# Altium footprint library uc_dev.PcbLib: 264 footprints (part 7 of 17)
Each footprint in its own frame and in the unit in brackets; x right, y up, seen from the top. Pads: shape width x height; smd on the part's side, far side on the other; paste and mask are expansions set on the pad; w line width, h text height; cw(c..) or ccw(c..) is an arc to the next point about the centre after c.
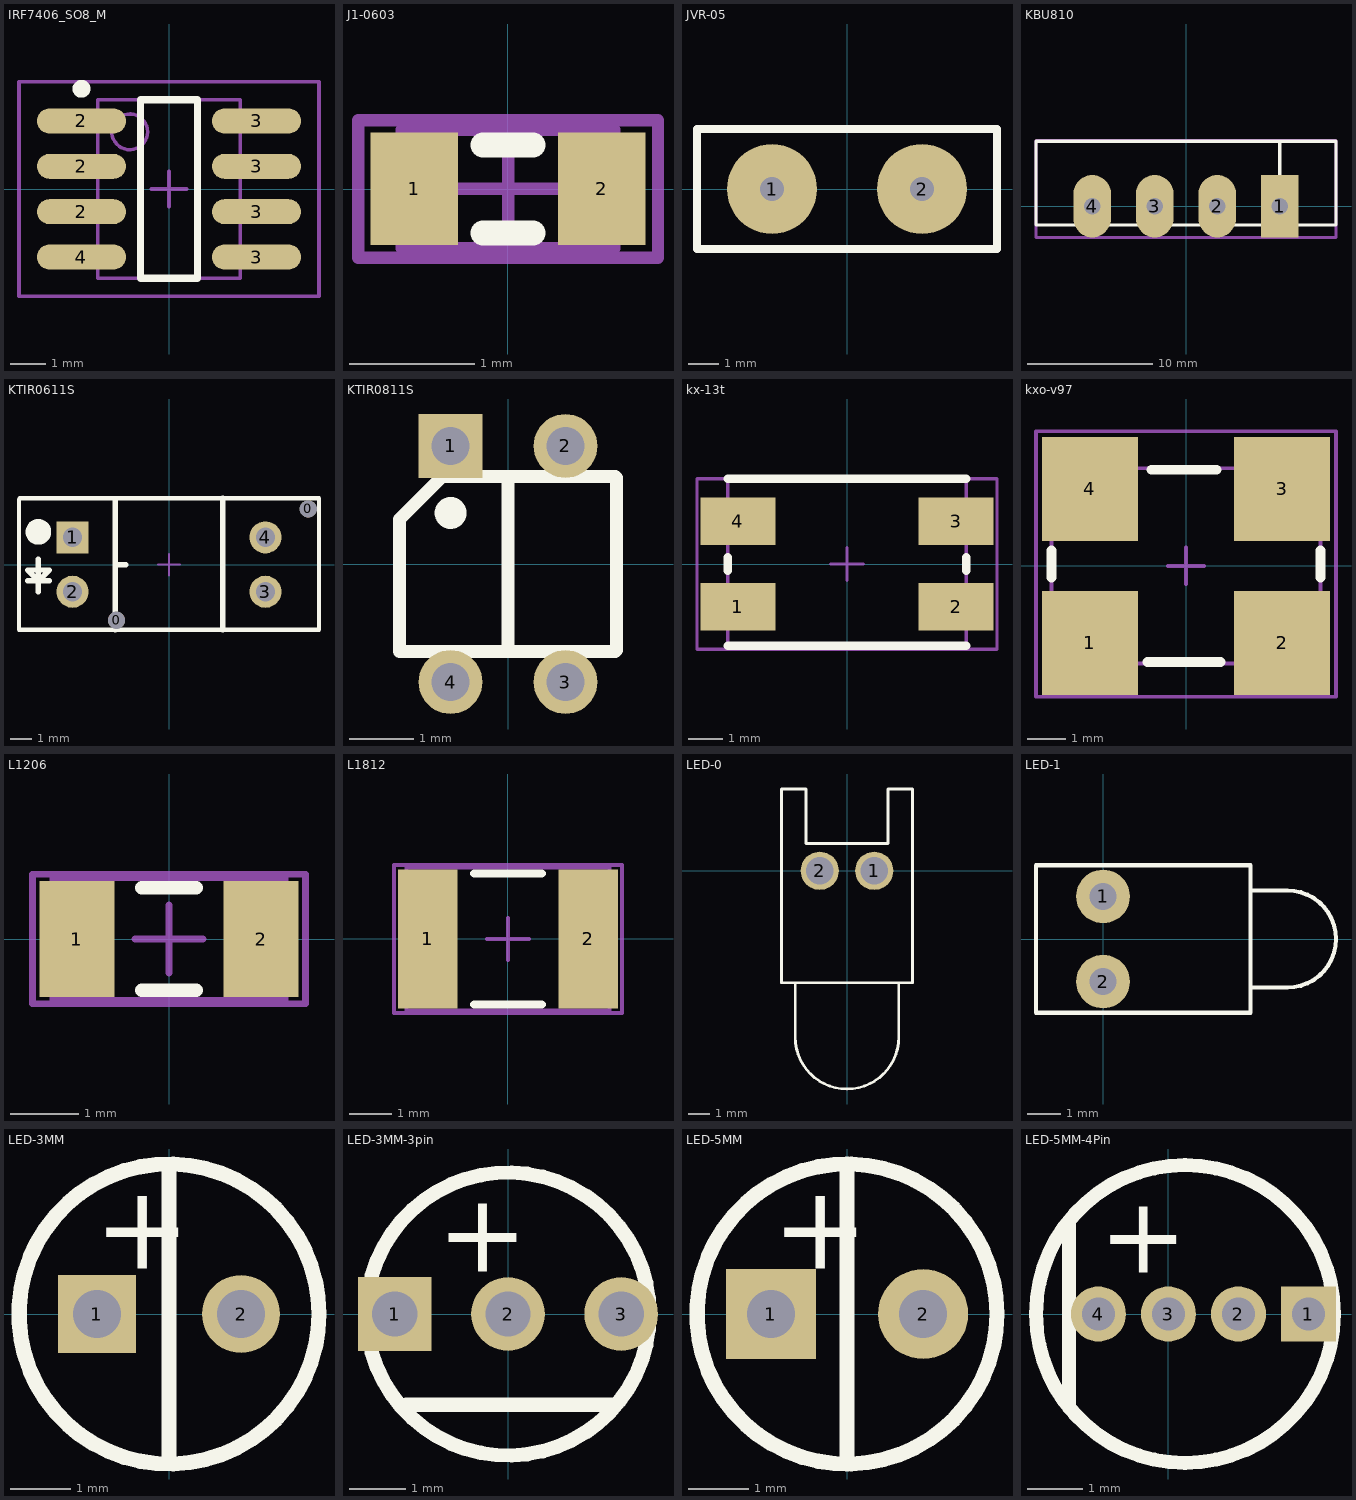
[diagram p6: the footprints below, top view; thin cyan lines are the x and y axes]

## IRF7406_SO8_M [mm] "SOIC, 8-Leads, Body 4.9x3.9mm, Pitch 1.27mm, IPC Low Density"
height 1.75
pads (8):
  oval 2.5x0.7 smd: 2(-2.45,-0.635) 2(-2.45,0.635) 2(-2.45,1.905) 3(2.45,-1.905) 3(2.45,-0.635) 3(2.45,0.635) 3(2.45,1.905) 4(-2.45,-1.905)
Top Overlay:
  circle w0.25: c-2.45,2.805 r0.125
  lines w0.2: -0.8,-2.5 -0.8,2.5 0.8,2.5 0.8,-2.5 -0.8,-2.5
Mechanical 13:
  circle w0.1: c-1.1,1.6 r0.5
  lines w0.1: -2,-2.5 -2,2.5 2,2.5 2,-2.5 -2,-2.5
Mechanical 15:
  lines w0.1: -0.5,0 0.5,0 ; 0,-0.5 0,0.5 ; -4.2,-3 -4.2,3 4.2,3 4.2,-3 -4.2,-3
3D body "User Library-SOIC-8-1.STEP": height 1.75, standoff 0, extent -3,-2.45 3,2.45

## J1-0603 [mm] "Chip Resistor, Body 1.6x0.8mm, IPC High Density"
height 0.9
pads (2):
  rect 0.7x0.9 smd: 1(-0.75,0) 2(0.75,0)
Top Overlay:
  lines w0.2: -0.2,-0.35 0.2,-0.35 ; -0.2,0.35 0.2,0.35
Mechanical 13:
  lines w0.1: -0.85,-0.475 0.85,-0.475 0.85,0.475 -0.85,0.475 -0.85,-0.475
Mechanical 15:
  lines w0.1: -0.475,0 0.475,0 ; 0,-0.475 0,0.475 ; -1.2,-0.55 1.2,-0.55 1.2,0.55 -1.2,0.55 -1.2,-0.55
3D body: height 0.9, standoff 0, extent -0.85,-0.475 0.85,0.475

## JVR-05 [mm] "Varistor"
pads (2):
  round 3 hole 0.8: 1(-2.5,0) 2(2.5,0)
Top Overlay:
  lines w0.254: -5,-2 -5,2 5,2 5,-2 -5,-2
Mechanical 13:
  circle w0.254: c-2.5,0 r0.4
3D body "SW3dPS-JVR10N331k_vertical-1.STEP": height 12, standoff -2.5, extent -5.497,-1.725 5.497,1.789

## KBU810 [mm] "DIODE BRIDGE"
height 13
pads (4):
  rect 3x5 hole 1.3: 1(7.5,0)
  oval 3x5 hole 1.3: 2(2.5,0) 3(-2.5,0) 4(-7.5,0)
Top Overlay:
  lines w0.254: 7.5,-1.5 7.5,5.2 ; -12,-1.5 12,-1.5 12,5.2 -12,5.2 -12,-1.5
Mechanical 15:
  lines w0.254: -12,-2.5 12,-2.5 12,5.25 -12,5.25 -12,-2.5
3D body "User Library-SIL 4A Bridge Rectifier 1.step": height 19.3, standoff -2, extent -11.45,-2.2 12.05,3.5

## KTIR0611S [mm] "PHOTO-INT"
height 5.6
pads (6):
  round 0.8 hole 0.8 unplated: 0(-2.45,-2.6) 0(6.5,2.6)
  rect 1.5x1.5 hole 0.9: 1(-4.5,1.27)
  round 1.5 hole 0.9: 2(-4.5,-1.27) 3(4.5,-1.27) 4(4.5,1.27)
Top Overlay:
  lines w0.2: -7,3.05 -7,-3.05 7,-3.05 7,3.05 ; -6.965,3.1 7,3.1
  lines w0.254: -6.096,-1.27 -6.096,0.254 ; -6.096,-1.016 -6.096,-0.762 ; -5.588,-0.762 -6.604,-0.762 -6.096,-0.762 ; -2.5,-3.05 -2.5,3 ; -2.5,0 -2.025,0 ; 2.5,-3.05 2.5,3.1 ; -6.096,-0.762 -6.604,-0.254 -5.588,-0.254 -6.096,-0.762
  lines w0.6: -5.817,1.635 ccw(c-6.096,1.524) -5.796,1.524
Mechanical 15:
  lines w0.1: -0.5,0 0.5,0 ; 0,-0.5 0,0.5
3D body "CircuitWorks-OPTOINTERRUPTER KB (KTIR0611S).step": height 10, standoff -2.5, extent -7,-2.95 7,3.15

## KTIR0811S [mm] "Switch; 2 Leads"
pads (4):
  rect 1x1 hole 0.6: 1(-0.9,1.85)
  round 1 hole 0.6: 2(0.9,1.85) 3(0.9,-1.85) 4(-0.9,-1.85)
Top Overlay:
  circle w0.25: c-0.9,0.8 r0.125
  lines w0.2: -1.7,-1.37 1.68,-1.37 1.7,-1.35 1.7,1.35 1.68,1.37 -1.03,1.37 -1.7,0.7 -1.7,-1.35 ; 0,-1.35 0,1.35
3D body "User Library-KTIR0811S_OptoSensor.step": height 1.5, standoff -10, extent -1.7,-1.85 1.7,1.85

## kx-13t [mm]
height 1.8
pads (4):
  rect 2.2x1.4 smd: 1(-3.2,-1.25) 2(3.2,-1.25) 3(3.2,1.25) 4(-3.2,1.25)
Top Overlay:
  lines w0.254: -3.5,-2.4 3.5,-2.4 ; -3.5,-0.2 -3.5,0.2 ; -3.5,2.5 3.5,2.5 ; 3.5,-0.2 3.5,0.2
Mechanical 13:
  lines w0.1: -3.5,-2.5 -3.5,2.5 3.5,2.5 3.5,-2.5 -3.5,-2.5
Mechanical 15:
  lines w0.1: -0.475,0 0.475,0 ; 0,-0.475 0,0.475 ; -4.4,-2.5 -4.4,2.5 4.4,2.5 4.4,-2.5 -4.4,-2.5
3D body: height 1.3, standoff 0, extent -3.5,-2.5 3.5,2.5

## kxo-v97 [mm]
height 1.8
pads (4):
  rect 2.5x2.7 smd: 1(-2.5,-2) 2(2.5,-2) 3(2.5,2) 4(-2.5,2)
Top Overlay:
  lines w0.254: -3.5,-0.3 -3.5,0.4 ; -1,-2.5 0.9,-2.5 ; -0.9,2.5 0.8,2.5 ; 3.5,-0.3 3.5,0.4
Mechanical 13:
  lines w0.1: -3.5,-2.54 -3.5,2.54 3.5,2.54 3.5,-2.54 -3.5,-2.54
Mechanical 15:
  lines w0.1: -0.475,0 0.475,0 ; 0,-0.475 0,0.475 ; -3.9,-3.4 3.9,-3.4 3.9,3.5 -3.9,3.5 -3.9,-3.4
3D body: height 1.8, standoff 0, extent -3.5,-2.54 3.5,2.54

## L1206 [mm] "LED"
height 1.3
pads (2):
  rect 1.1x1.7 smd: 1(-1.35,0) 2(1.35,0)
Top Overlay:
  lines w0.2: -0.4,-0.75 0.4,-0.75 ; -0.4,0.75 0.4,0.75
Mechanical 13:
  lines w0.1: -1.7,-0.9 -1.7,0.9 1.7,0.9 1.7,-0.9 -1.7,-0.9
Mechanical 15:
  lines w0.1: -0.5,0 0.5,0 ; 0,-0.5 0,0.5 ; -2,-0.95 -2,0.95 2,0.95 2,-0.95 -2,-0.95
3D body "User Library-FYLS-1206.step": height 1.1, standoff 0, extent -1.573,-0.815 1.627,0.785

## L1812 [mm] "Chip Capacitor, Body 4.5x3.2mm, IPC High Density"
height 1.4
pads (2):
  rect 1.4x3.3 smd: 1(-1.9,0) 2(1.9,0)
Top Overlay:
  lines w0.2: -0.8,-1.55 0.8,-1.55 ; -0.8,1.55 0.8,1.55
Mechanical 13:
  lines w0.1: -2.4,-1.7 2.4,-1.7 2.4,1.7 -2.4,1.7 -2.4,-1.7
Mechanical 15:
  lines w0.1: -0.5,0 0.5,0 ; 0,-0.5 0,0.5 ; -2.7,-1.75 2.7,-1.75 2.7,1.75 -2.7,1.75 -2.7,-1.75
3D body "User Library-LQH43C.STEP": height 2.6, standoff 0, extent -2.35,-1.6 2.35,1.6

## LED-0 [mil] "LED; 2 Leads"
pads (2):
  round 70 hole 50: 1(50,0) 2(-50,0)
Top Overlay:
  lines w5: -95,-205 -95,-305 ccw(c0,-305) 95,-305 95,-205 ; -120,-205 -120,150 -75,150 -75,50 75,50 75,150 120,150 120,-205 -120,-205

## LED-1 [mm] "LED; 2 Leads"
pads (2):
  round 1.6 hole 0.8: 1(0,1.27) 2(0,-1.27)
Top Overlay:
  lines w0.127: 4.4,-1.45 5.5,-1.45 ccw(c5.5,0) 5.5,1.45 4.4,1.45 ; -2,-2.2 -2,2.2 4.4,2.2 4.4,-2.2 -2,-2.2

## LED-3MM [mm] "LED-3MM"
pads (2):
  rect 1.3x1.3 hole 0.8: 1(-1.2,0)
  round 1.3 hole 0.8: 2(1.2,0)
Top Overlay:
  circle w0.254: c0,0 r2.5
  lines w0.254: 0,-2.425 0,2.475
  text "+" at -1.25,0.75 h1.4
3D body "CircuitWorks-LED DIP 3MM.step": height 6.5, standoff -2, extent -1.825,-1.925 1.675,1.875

## LED-3MM-3pin [mm] "LED-3MM 3 Pin comm cathode"
pads (3):
  rect 1.3x1.3 hole 0.8: 1(-2,0)
  round 1.3 hole 0.8: 2(0,0) 3(2,0)
Top Overlay:
  circle w0.254: c0,0 r2.5
  lines w0.254: -1.8,-1.6 1.9,-1.6
  text "+" at -1.25,0.75 h1.4
3D body "User Library-LED RG.step": height 9.43, standoff -4, extent -2.25,-2 2.25,2

## LED-5MM [mm] "LED-5MM"
pads (2):
  rect 1.5x1.5 hole 0.8: 1(-1.27,0)
  round 1.5 hole 0.8: 2(1.27,0)
Top Overlay:
  circle w0.254: c0,0 r2.5
  lines w0.254: 0,-2.5 0,2.5
  text "+" at -1.25,0.75 h1.4
3D body "User Library-LED5ON-Red.STEP": height 8.5, standoff -5, extent -3,-3 2.5,3

## LED-5MM-4Pin [mm] "LED-5MM-4Pin"
pads (4):
  rect 1x1 hole 0.6: 1(2.54,0)
  round 1 hole 0.6: 2(1.27,0) 3(0,0) 4(-1.27,0)
Top Overlay:
  circle w0.254: c0.3,0 r2.702
  lines w0.254: -1.8,-1.7 -1.8,1.6
  text "+" at -1.25,0.75 h1.4
3D body "User Library-LED5ON-Red.STEP": height 8.5, standoff -5, extent -2.5,-2.9 3,3.1